# Altium footprint library Toi Library.PcbLib: 740 footprints (part 46 of 47)
Each footprint in its own frame and in the unit in brackets; x right, y up, seen from the top. Pads: shape width x height; smd on the part's side, far side on the other; paste and mask are expansions set on the pad; w line width, h text height; cw(c..) or ccw(c..) is an arc to the next point about the centre after c.
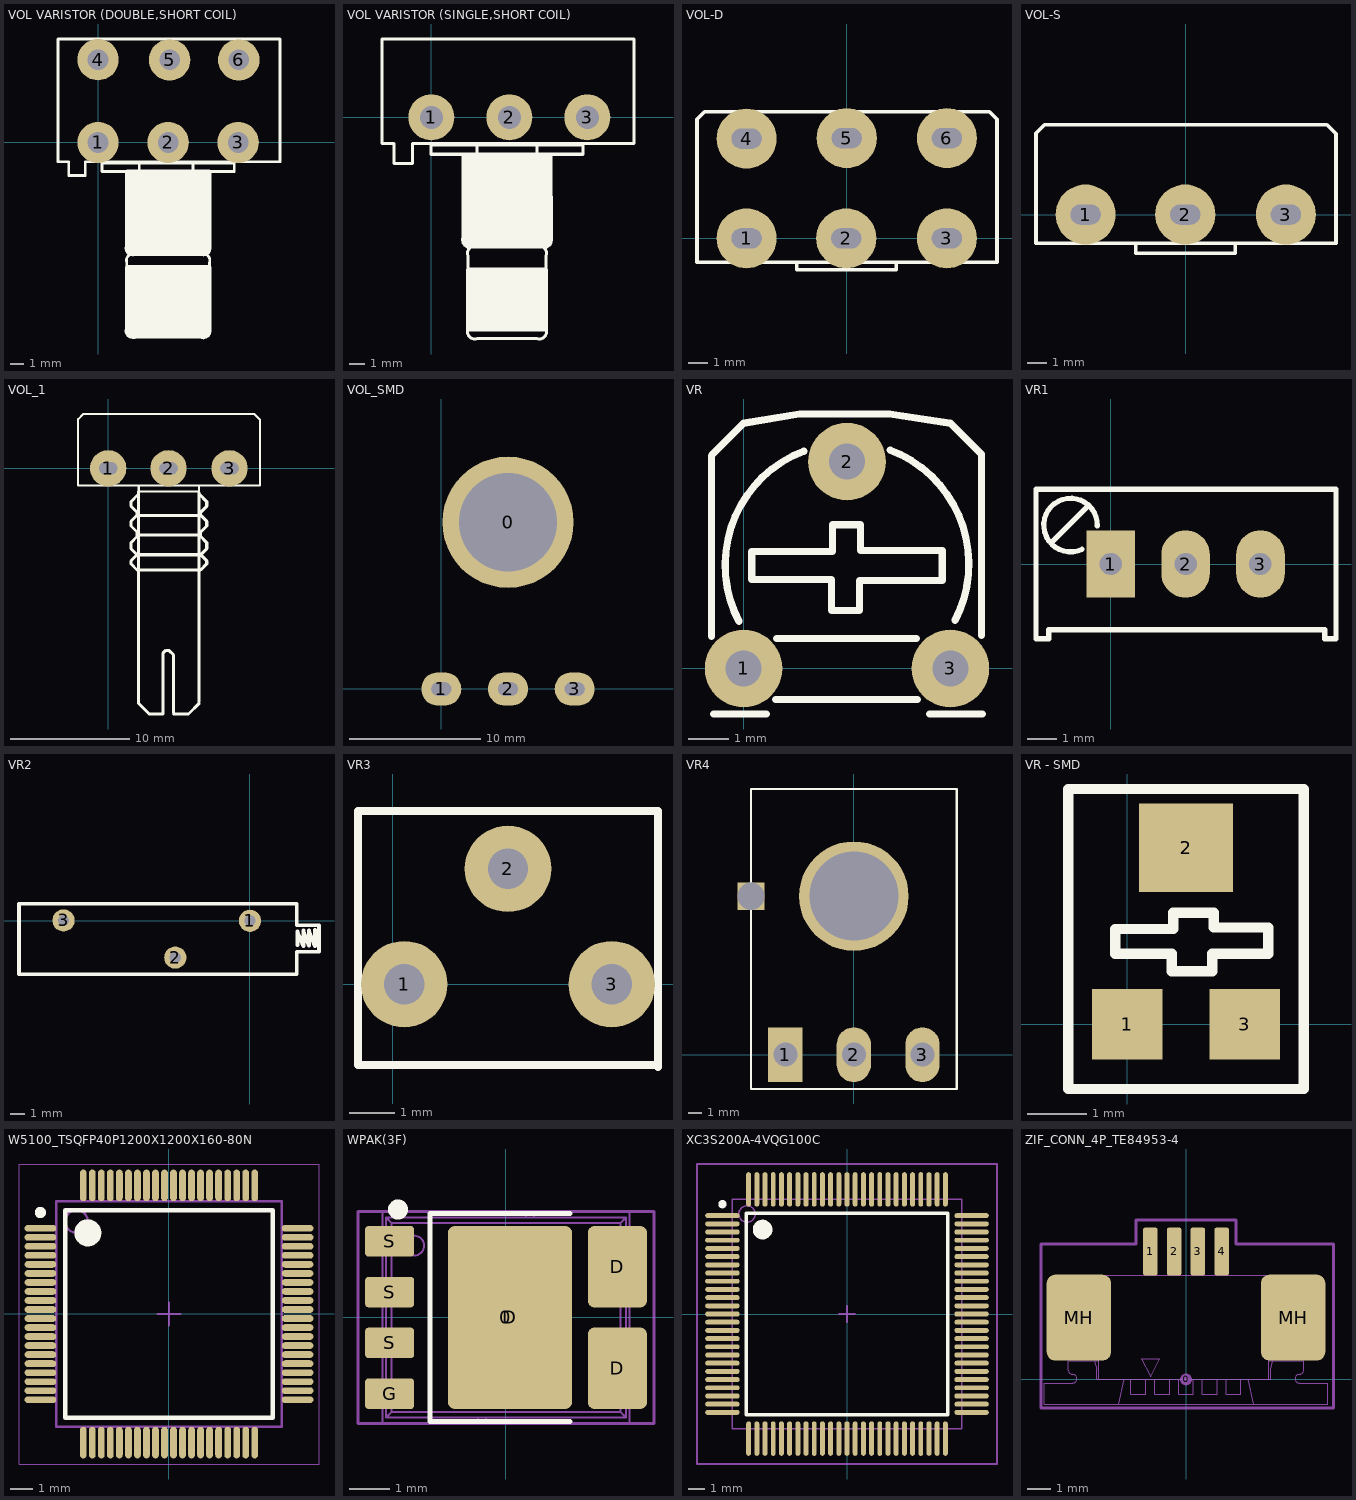
[diagram p45: the footprints below, top view; thin cyan lines are the x and y axes]

## VOL VARISTOR (DOUBLE,SHORT COIL) [mm]
pads (6):
  round 3 hole 1.5: 1(0,0) 2(5.08,0) 3(10.16,0) 4(0,6.003) 5(5.19,5.991) 6(10.201,5.991)
Top Overlay:
  region: 8.119,-2.009 8.158,-2.024 8.158,-2.025 8.174,-2.063 8.19,-2.101 8.193,-7.492 8.221,-7.632 8.217,-7.653 8.221,-7.675 8.184,-7.86 8.172,-7.878 8.168,-7.899 8.063,-8.056 8.045,-8.068 8.033,-8.086 7.876,-8.191 7.855,-8.195 7.837,-8.207 7.652,-8.244 7.631,-8.239 7.61,-8.244 7.459,-8.213 7.457,-8.212 2.691,-8.216 2.55,-8.244 2.529,-8.239 2.507,-8.244 2.322,-8.207 2.304,-8.195 2.283,-8.191 2.126,-8.086 2.114,-8.068 2.096,-8.056 1.991,-7.899 1.987,-7.878 1.975,-7.86 1.938,-7.675 1.943,-7.653 1.938,-7.632 1.968,-7.481 1.97,-7.478 1.97,-2.101 2.002,-2.025 2.079,-1.993 8.081,-1.993
  region: 8.158,-8.928 8.19,-9.004 8.19,-13.482 8.191,-13.484 8.221,-13.635 8.217,-13.656 8.221,-13.677 8.184,-13.863 8.172,-13.881 8.168,-13.902 8.063,-14.059 8.045,-14.071 8.033,-14.088 7.876,-14.193 7.855,-14.198 7.837,-14.21 7.652,-14.246 7.631,-14.242 7.61,-14.246 7.469,-14.218 2.703,-14.214 2.701,-14.216 2.55,-14.246 2.529,-14.242 2.507,-14.246 2.322,-14.209 2.305,-14.197 2.283,-14.193 2.127,-14.088 2.115,-14.07 2.097,-14.058 1.992,-13.901 1.988,-13.88 1.976,-13.862 1.939,-13.677 1.943,-13.656 1.939,-13.635 1.969,-13.484 1.97,-13.482 1.97,-9.004 2.002,-8.928 2.079,-8.896 8.081,-8.896
  lines w0.2: 2.679,-14.107 7.481,-14.107 ccw(c7.631,-13.656) 8.081,-13.506 8.081,-8.704 ccw(c7.631,-8.554) 7.481,-8.103 ; 2.679,-14.106 cw(c2.529,-13.656) 2.079,-13.506 2.079,-8.704 cw(c2.529,-8.554) 2.679,-8.104 ; 2.679,-8.103 cw(c2.529,-7.653) 2.079,-7.504 2.079,-2.101 8.081,-2.101 8.081,-7.504 cw(c7.631,-7.653) 7.481,-8.104 ; 2.679,-8.104 7.481,-8.104 ; 2.679,-8.104 7.481,-8.104 ; -2.897,-1.4 -2.123,-1.4 -2.123,-2.399 -0.923,-2.399 -0.923,-1.4 13.184,-1.4 13.184,7.504 -2.897,7.504 -2.897,-1.4 ; 0.278,-2.101 9.882,-2.101 9.882,-1.501 0.278,-1.501 0.278,-2.101 ; 2.979,-2.101 2.979,-1.501 6.881,-1.501 6.881,-2.101 2.979,-2.101

## VOL VARISTOR (SINGLE,SHORT COIL) [mm]
pads (3):
  round 3 hole 1.5: 1(0,0) 2(5.08,0) 3(10.16,0)
Top Overlay:
  region: 7.819,-2.309 7.858,-2.325 7.874,-2.363 7.889,-2.401 7.893,-7.792 7.921,-7.932 7.917,-7.954 7.921,-7.975 7.884,-8.16 7.872,-8.178 7.868,-8.199 7.763,-8.356 7.745,-8.368 7.733,-8.386 7.576,-8.491 7.555,-8.495 7.537,-8.507 7.352,-8.544 7.331,-8.539 7.31,-8.544 7.159,-8.514 7.157,-8.512 2.691,-8.516 2.55,-8.544 2.529,-8.54 2.507,-8.544 2.322,-8.507 2.304,-8.495 2.283,-8.491 2.126,-8.386 2.114,-8.368 2.096,-8.356 1.991,-8.199 1.987,-8.178 1.975,-8.16 1.938,-7.975 1.943,-7.954 1.938,-7.932 1.968,-7.781 1.97,-7.778 1.97,-2.401 2.002,-2.325 2.079,-2.293 7.781,-2.293
  region: 7.558,-9.828 7.589,-9.905 7.589,-13.807 7.558,-13.883 7.481,-13.915 2.379,-13.915 2.302,-13.883 2.271,-13.807 2.271,-9.905 2.302,-9.828 2.379,-9.797 7.481,-9.797
  lines w0.2: 2.078,-7.804 ccw(c2.529,-7.954) 2.679,-8.404 7.181,-8.404 ccw(c7.331,-7.954) 7.781,-7.804 7.781,-2.401 2.079,-2.401 2.079,-7.804 ; -3.197,-1.7 -3.197,5.102 13.184,5.102 13.184,-1.7 -1.223,-1.7 -1.223,-3.001 -2.424,-3.001 -2.424,-1.7 -3.197,-1.7 ; -0.022,-2.401 9.882,-2.401 9.882,-1.801 -0.022,-1.801 -0.022,-2.401 ; 2.379,-13.807 ccw(c2.829,-13.956) 2.979,-14.406 6.881,-14.407 ccw(c7.031,-13.956) 7.481,-13.807 7.481,-9.004 ccw(c7.031,-8.854) 6.881,-8.404 2.979,-8.404 ccw(c2.829,-8.854) 2.379,-9.004 2.379,-13.807 ; 2.979,-2.401 2.979,-1.801 6.881,-1.801 6.881,-2.401 2.979,-2.401

## VOL-D [mil] "Volume control Dual"
height 400
pads (6):
  round 120 hole 40 slot 60 at 0 deg: 1(-200,0) 2(-1,0) 3(200,0) 4(-200,199) 5(0,200) 6(200,200)
Top Overlay:
  lines w7: -100,-48 -100,-63 99,-63 99,-48 ; -299,-48 300,-48 300,238 285,253 -284,253 -299,238 -299,-48
3D body "SW3dPS-ALPHA-potentiometer stereo PCB mount.STEP": height 834.65, standoff -129.92, extent -338.65,-1309.27 330.65,299

## VOL-S [mil] "Volume control single"
height 400
pads (3):
  round 120 hole 40 slot 60 at 0 deg: 1(-200,0) 2(-1,0) 3(200,0)
Top Overlay:
  lines w7: -100,-57 -100,-77 99,-77 99,-57 ; -299,-57 300,-57 300,161 282,179 -282,179 -299,162 -299,-57

## VOL_1 [mil] "Resistorvar Volume"
pads (3):
  round 120 hole 40 slot 60 at 0 deg: 1(0,0) 2(199,0) 3(400,0)
Top Overlay:
  lines w7: 100,-57 100,-77 299,-77 299,-57 ; 101,-77 101,-57 ; -99,-57 -99,162 -82,179 482,179 500,161 500,-57 -99,-57
  lines w10: 95,-335 75,-315 75,-305 95,-285 75,-265 75,-245 95,-225 95,-210 75,-190 75,-175 95,-155 95,-145 75,-125 75,-110 100,-85 ; 95,-220 300,-220 ; 100,-770 100,-77 ; 100,-760 100,-775 135,-810 180,-810 180,-610 190,-600 200,-600 215,-615 215,-805 ; 100,-335 305,-335 325,-315 325,-305 305,-285 ; 100,-285 305,-285 ; 105,-155 300,-155 ; 215,-810 265,-810 300,-775 ; 300,-770 300,-80 ; 300,-85 325,-110 325,-125 305,-145 305,-155 325,-175 325,-190 305,-210 305,-225 325,-245 325,-265 305,-285
3D body "SW3dPS-Pot.STEP": height 839.35, standoff -130, extent -110,-818.11 510,188.11

## VOL_SMD [mil] "Resistorvar Volume"
pads (4):
  round 393.7 hole 295.28: 0(200,500)
  oval 120x100 hole 40 slot 60 at 0 deg: 1(0,0) 2(200,0) 3(400,0)
Bottom Overlay:
  circle w12: c400,150 r50
  circle w12: c200,150 r50
  circle w12: c0,150 r50
  circle w12: c200,500 r215.01
  lines w12: -57.25,301.71 cw(c200,500) 455.57,299.55 ; -55,299 127,299 ; -49,700 119,700 ; 281,298 455,298 ; 286,698 454,698 ; 455,295 500,250 500,-75 -100,-75 -100,255 ; -100,255 -55,300 -100,255
3D body "SW3dPS-omeg pot.STEP": height 866.14, standoff -407.48, extent -203.15,-247.08 600,947.08

## VR [mil] "Resistor Variable"
height 200
pads (3):
  round 75 hole 35: 1(0,0) 2(100,200) 3(200,0)
Top Overlay:
  lines w7: -31,31 -31,206 0,237 54,246 141.5,246 200,237 230,207 230,32 ; -29,-44 22,-44 ; -4.35,45.34 cw(c100,100) 58.1,210.1 ; 8,113 8,86 85,86 85,56 112,56 112,85 192,85 192,114 113,114 113,139 86,139 86,113 9,113 ; 31,-30 168,-30 ; 32,29 167,29 ; 141.9,211.1 cw(c100,101) 204.35,46.34 ; 180,-44 231,-44
3D body "SW3dPS-Trimpot Horizontal.STEP": height 165.35, standoff -220.47, extent -86.85,-30 306.85,371.57

## VR1 [mil] "Variable Resistor"
height 400
pads (3):
  rect 65x90 hole 30: 1(0,0)
  oval 65x90 hole 30: 2(100,0) 3(200,0)
Top Overlay:
  lines w7: -80,28 -30,78 ; -38.6,19.63 cw(c-53.79,52.05) -18.01,50.77 ; -100,-100 -83,-100 -83,-88 286,-88 286,-100 301,-100 301,100 -100,100 -100,-100
3D body "User Library-3296W.STEP": height 454.72, standoff -59.06, extent -86.6,-94.16 288.6,96

## VR2 [mil]
pads (3):
  round 60 hole 30: 1(0,0) 2(-201,-99) 3(-502,1)
Top Overlay:
  lines w10: 125,46 -622,46 -622,-144 125,-144 126,-144 126,-83 186,-83 186,-12 126,-12 126,46 ; 128,-66 128,-29 144,-68 144,-26 159,-67 159,-26 175,-68 175,-25
3D body "Trimmer_L_10K.STEP": height 250.6, standoff -209.24, extent -621.92,-144 187.92,46.16

## VR3 [mil] "Resistor Variable"
height 200
pads (3):
  round 75 hole 35: 1(10,0) 2(100,100) 3(190,0)
Top Overlay:
  lines w7: 227.95,-70 -30,-70 -30,150 230,150 230,-71.6
3D body "User Library-RM-063.STEP": height 413.39, standoff -31.87, extent -27.95,-71.6 227.95,150

## VR4 [mil] "Resistor Variable"
height 200
pads (5):
  rect 100x160 hole 70: 1(-200,0)
  oval 100x160 hole 70: 2(0,0) 3(200,0)
  rect 80x80 hole 80 square: ""(-300,462.5)
  round 320 hole 260: ""(0,462.5)
Top Overlay:
  lines w7: -300,-100 300,-100 300,775 -300,775 -300,-100
3D body "User Library-Perilla  P-4836 azul.STEP": height 751.18, standoff 200, extent -334.65,112.68 334.65,797.15
3D body "SW3dPS-Pot.STEP": height 716.22, standoff -290, extent -310,-200 310,770

## VR - SMD [mm] "Resistor Variable"
height 5.08
pads (3):
  rect 1.2x1.2 smd: 1(0,0) 3(2,0)
  rect 1.6x1.5 smd: 2(1,3)
Top Overlay:
  lines w0.178: -1,-1.1 -1,4 3,4 3,-1.1 -1,-1.1 ; -0.2,1.2 -0.2,1.62 0.784,1.62 0.784,1.9 1.47,1.9 1.47,1.646 2.4,1.646 2.4,1.2 1.445,1.2 1.445,0.9 0.759,0.9 0.759,1.2 -0.2,1.2
3D body "User Library-TC-33X-2.STEP": height 1.13, standoff -0.02, extent -0.8,-0.413 2.8,3.55

## W5100_TSQFP40P1200X1200X160-80N [mm] "TSQFP, 80-Leads, Body 10.00x10.00mm, Pitch 0.40mm, IPC Medium Density"
height 1.6
pads (80):
  oval 1.4x0.3 smd: 1(-5.7,3.8) 2(-5.7,3.4) 3(-5.7,3) 4(-5.7,2.6) 5(-5.7,2.2) 6(-5.7,1.8) 7(-5.7,1.4) 8(-5.7,1) 9(-5.7,0.6) 10(-5.7,0.2) 11(-5.7,-0.2) 12(-5.7,-0.6) 13(-5.7,-1) 14(-5.7,-1.4) 15(-5.7,-1.8) 16(-5.7,-2.2) 17(-5.7,-2.6) 18(-5.7,-3) 19(-5.7,-3.4) 20(-5.7,-3.8) 41(5.7,-3.8) 42(5.7,-3.4) 43(5.7,-3) 44(5.7,-2.6) 45(5.7,-2.2) 46(5.7,-1.8) 47(5.7,-1.4) 48(5.7,-1) 49(5.7,-0.6) 50(5.7,-0.2) 51(5.7,0.2) 52(5.7,0.6) 53(5.7,1) 54(5.7,1.4) 55(5.7,1.8) 56(5.7,2.2) 57(5.7,2.6) 58(5.7,3) 59(5.7,3.4) 60(5.7,3.8)
  oval 0.3x1.4 smd: 21(-3.8,-5.7) 22(-3.4,-5.7) 23(-3,-5.7) 24(-2.6,-5.7) 25(-2.2,-5.7) 26(-1.8,-5.7) 27(-1.4,-5.7) 28(-1,-5.7) 29(-0.6,-5.7) 30(-0.2,-5.7) 31(0.2,-5.7) 32(0.6,-5.7) 33(1,-5.7) 34(1.4,-5.7) 35(1.8,-5.7) 36(2.2,-5.7) 37(2.6,-5.7) 38(3,-5.7) 39(3.4,-5.7) 40(3.8,-5.7) 61(3.8,5.7) 62(3.4,5.7) 63(3,5.7) 64(2.6,5.7) 65(2.2,5.7) 66(1.8,5.7) 67(1.4,5.7) 68(1,5.7) 69(0.6,5.7) 70(0.2,5.7) 71(-0.2,5.7) 72(-0.6,5.7) 73(-1,5.7) 74(-1.4,5.7) 75(-1.8,5.7) 76(-2.2,5.7) 77(-2.6,5.7) 78(-3,5.7) 79(-3.4,5.7) 80(-3.8,5.7)
Top Overlay:
  circle w0.25: c-5.7,4.5 r0.125
  circle w0.6: c-3.6,3.6 r0.3
  lines w0.2: -4.6,-4.6 -4.6,4.6 4.6,4.6 4.6,-4.6 -4.6,-4.6
Mechanical 13:
  circle w0.1: c-4.1,4.1 r0.5
  lines w0.1: -5,-5 -5,5 5,5 5,-5 -5,-5
Mechanical 15:
  lines w0.05: -6.65,-6.65 -6.65,6.65 6.65,6.65 6.65,-6.65 -6.65,-6.65
  lines w0.1: -0.5,0 0.5,0 ; 0,-0.5 0,0.5
3D body: height 1.6, standoff 0, extent -6,-6 6,6

## WPAK(3F) [mm] "Footprint similar to SOIC-8, Body 5.1x6.1mm, Pitch 1.27mm, IPC Medium Density"
height 0.85
pads (8):
  round 1 on Mech15: 0(0,0)
  rrect10% 3.1x4.57 smd: D(0.1,0)
  rrect20% 1.47x2.03 smd: D(2.785,-1.27) D(2.785,1.27)
  rrect20% 1.22x0.76 smd: G(-2.91,-1.905) S(-2.91,-0.635) S(-2.91,0.635) S(-2.91,1.905)
Top Overlay:
  circle w0.25: c-2.7,2.7 r0.125
  lines w0.127: 1.6,-2.6 -1.9,-2.6 -1.9,2.6 1.6,2.6
Mechanical 13:
  circle w0.05: c-2.298,1.798 r0.25
  lines w0.05: -3.09,-2.115 -3.09,-2.64 -0.7,-2.64 ; -3.09,-1.695 -3.09,-0.845 ; -3.09,-0.425 -3.09,0.425 ; -3.09,0.845 -3.09,1.695 ; -3.09,2.115 -3.09,2.64 0.5,2.64 ; -3,-2.115 -3,-2.5 ; -3,-1.695 -3,-0.845 ; -3,-0.425 -3,0.425 ; -3,0.845 -3,1.695 ; -3,2.115 -3,2.5 ; -0.7,-2.5 -3,-2.5 ; -0.5,-2.64 3.09,-2.64 3.09,-2.115 ; -0.5,-2.5 3,-2.5 ; 0.5,2.5 -3,2.5 ; 0.7,2.5 3,2.5 ; 0.7,2.64 3.09,2.64 3.09,2.115 ; 3,-2.115 3,-2.5 ; 3,-1.695 3,-0.845 ; 3,-0.425 3,0.425 ; 3,0.845 3,1.695 ; 3,2.115 3,2.5 ; 3.09,-1.695 3.09,-0.845 ; 3.09,-0.425 3.09,0.425 ; 3.09,0.845 3.09,1.695 ; -3,-2.5 -2.864,-2.364 ; -3,2.5 -2.864,2.364 ; -2.864,-2.364 -2.864,2.364 ; -2.864,-2.364 2.864,-2.364 ; -2.864,2.364 2.864,2.364 ; 2.864,-2.364 3,-2.5 ; 2.864,-2.364 2.864,2.364 ; 2.864,2.364 3,2.5 ; -3.1,-2.115 -3.1,-1.695 -2.998,-1.695 -2.998,-2.115 -3.1,-2.115 ; -3.1,-0.845 -3.1,-0.425 -2.998,-0.425 -2.998,-0.845 -3.1,-0.845 ; -3.1,0.425 -3.1,0.845 -2.998,0.845 -2.998,0.425 -3.1,0.425 ; -3.1,1.695 -3.1,2.115 -2.998,2.115 -2.998,1.695 -3.1,1.695 ; -0.7,-2.65 -0.5,-2.65 -0.5,-2.498 -0.7,-2.498 -0.7,-2.65 ; 0.5,2.498 0.7,2.498 0.7,2.65 0.5,2.65 0.5,2.498 ; 2.998,-2.115 2.998,-1.695 3.1,-1.695 3.1,-2.115 2.998,-2.115 ; 2.998,-0.845 2.998,-0.425 3.1,-0.425 3.1,-0.845 2.998,-0.845 ; 2.998,0.425 2.998,0.845 3.1,0.845 3.1,0.425 2.998,0.425 ; 2.998,1.695 2.998,2.115 3.1,2.115 3.1,1.695 2.998,1.695
Mechanical 15:
  lines w0.076: -3.7,-2.65 -3.7,2.65 3.7,2.65 3.7,-2.65 -3.7,-2.65
3D body "WPAK(3F).STEP": height 0.85, standoff 0, extent -3.1,-2.65 3.1,2.65

## XC3S200A-4VQG100C [mm] "Thin QFP, 100-Leads, Body 14x14mm, Pitch 0.5mm, IPC Low Density"
height 1.2
pads (100):
  oval 2.1x0.3 smd: 1(-7.6,6) 2(-7.6,5.5) 3(-7.6,5) 4(-7.6,4.5) 5(-7.6,4) 6(-7.6,3.5) 7(-7.6,3) 8(-7.6,2.5) 9(-7.6,2) 10(-7.6,1.5) 11(-7.6,1) 12(-7.6,0.5) 13(-7.6,0) 14(-7.6,-0.5) 15(-7.6,-1) 16(-7.6,-1.5) 17(-7.6,-2) 18(-7.6,-2.5) 19(-7.6,-3) 20(-7.6,-3.5) 21(-7.6,-4) 22(-7.6,-4.5) 23(-7.6,-5) 24(-7.6,-5.5) 25(-7.6,-6) 51(7.6,-6) 52(7.6,-5.5) 53(7.6,-5) 54(7.6,-4.5) 55(7.6,-4) 56(7.6,-3.5) 57(7.6,-3) 58(7.6,-2.5) 59(7.6,-2) 60(7.6,-1.5) 61(7.6,-1) 62(7.6,-0.5) 63(7.6,0) 64(7.6,0.5) 65(7.6,1) 66(7.6,1.5) 67(7.6,2) 68(7.6,2.5) 69(7.6,3) 70(7.6,3.5) 71(7.6,4) 72(7.6,4.5) 73(7.6,5) 74(7.6,5.5) 75(7.6,6)
  oval 0.3x2.1 smd: 26(-6,-7.6) 27(-5.5,-7.6) 28(-5,-7.6) 29(-4.5,-7.6) 30(-4,-7.6) 31(-3.5,-7.6) 32(-3,-7.6) 33(-2.5,-7.6) 34(-2,-7.6) 35(-1.5,-7.6) 36(-1,-7.6) 37(-0.5,-7.6) 38(0,-7.6) 39(0.5,-7.6) 40(1,-7.6) 41(1.5,-7.6) 42(2,-7.6) 43(2.5,-7.6) 44(3,-7.6) 45(3.5,-7.6) 46(4,-7.6) 47(4.5,-7.6) 48(5,-7.6) 49(5.5,-7.6) 50(6,-7.6) 76(6,7.6) 77(5.5,7.6) 78(5,7.6) 79(4.5,7.6) 80(4,7.6) 81(3.5,7.6) 82(3,7.6) 83(2.5,7.6) 84(2,7.6) 85(1.5,7.6) 86(1,7.6) 87(0.5,7.6) 88(0,7.6) 89(-0.5,7.6) 90(-1,7.6) 91(-1.5,7.6) 92(-2,7.6) 93(-2.5,7.6) 94(-3,7.6) 95(-3.5,7.6) 96(-4,7.6) 97(-4.5,7.6) 98(-5,7.6) 99(-5.5,7.6) 100(-6,7.6)
Top Overlay:
  circle w0.6: c-5.15,5.15 r0.3
  circle w0.25: c-7.6,6.7 r0.125
  lines w0.2: -6.15,-6.15 6.15,-6.15 6.15,6.15 -6.15,6.15 -6.15,-6.15
Mechanical 13:
  circle w0.1: c-6.1,6.1 r0.5
  lines w0.1: -7,-7 7,-7 7,7 -7,7 -7,-7
Mechanical 15:
  lines w0.1: -0.5,0 0.5,0 ; 0,-0.5 0,0.5 ; -9.15,-9.15 9.15,-9.15 9.15,9.15 -9.15,9.15 -9.15,-9.15
3D body: height 1.3, standoff 0, extent -8.047,-8.052 8,7.995

## ZIF_CONN_4P_TE84953-4 [mm] "TE Connectivity 4-pin ZIF connector"
height 2.74
pads (7):
  round 0.5 on Mech15: 0(0,0)
  rrect25% 0.61x2 smd: 1(-1.5,5.375) 2(-0.5,5.375) 3(0.5,5.375) 4(1.5,5.375)
  rrect25% 2.7x3.6 smd: MH(-4.5,2.6) MH(4.5,2.6)
Mechanical 13:
  lines w0.05: -4.56,3.1 -3.93,3.1 ; -4.56,4.37 -4.56,0.87 -3.67,0.87 -3.67,0 ; -4.28,4.37 -4.18,3.997 -4.18,3.1 ; -4.18,0.86 -4.18,0.87 ; -3.982,0.87 -3.982,0.86 -5.072,0.86 cw(c-5.072,0.96) -5.172,0.96 -5.172,1.261 cw(c-5.072,1.261) -5.072,1.361 -4.762,1.361 ccw(c-4.762,1.461) -4.662,1.461 -4.662,1.763 ccw(c-4.762,1.763) -4.762,1.863 -5.072,1.863 cw(c-5.072,1.963) -5.172,1.963 -5.172,2.264 cw(c-5.072,2.264) -5.072,2.364 -4.762,2.364 ccw(c-4.762,2.464) -4.662,2.464 -4.662,2.766 ccw(c-4.762,2.766) -4.762,2.866 -5.072,2.866 cw(c-5.072,2.966) -5.172,2.966 -5.172,3.267 cw(c-5.072,3.267) -5.072,3.367 -4.762,3.367 ccw(c-4.762,3.467) -4.662,3.467 -4.662,3.769 ccw(c-4.762,3.769) -4.762,3.869 -5.072,3.869 cw(c-5.072,3.969) -5.172,3.969 -5.172,4.27 cw(c-5.072,4.27) -5.072,4.37 5.072,4.37 cw(c5.072,4.27) 5.172,4.27 5.172,3.969 cw(c5.072,3.969) 5.072,3.869 4.762,3.869 ccw(c4.762,3.769) 4.662,3.769 4.662,3.467 ccw(c4.762,3.467) 4.762,3.367 5.072,3.367 cw(c5.072,3.267) 5.172,3.267 5.172,2.966 cw(c5.072,2.966) 5.072,2.866 4.762,2.866 ccw(c4.762,2.766) 4.662,2.766 4.662,2.464 ccw(c4.762,2.464) 4.762,2.364 5.072,2.364 cw(c5.072,2.264) 5.172,2.264 5.172,1.963 cw(c5.072,1.963) 5.072,1.863 4.762,1.863 ccw(c4.762,1.763) 4.662,1.763 4.662,1.461 ccw(c4.762,1.461) 4.762,1.361 5.072,1.361 cw(c5.072,1.261) 5.172,1.261 5.172,0.96 cw(c5.072,0.96) 5.072,0.86 4.232,0.86 4.229,0.87 ; -3.93,0.87 -3.93,3.997 -3.83,4.37 ; -3.846,0.79 -3.75,0.43 -3.75,0 3.55,0 3.55,0.43 3.646,0.79 ; -3.67,0.79 -4.94,0.79 -4.94,0.39 ccw(c-4.76,0.39) -4.76,0.21 cw(c-4.76,0.03) -4.76,-0.15 -5.96,-0.15 -5.96,-1.04 5.96,-1.04 5.96,-0.15 4.76,-0.15 cw(c4.76,0.03) 4.76,0.21 ccw(c4.76,0.39) 4.94,0.39 4.94,0.79 3.47,0.79 ; -2.82,-1.04 -2.59,0 ; -2.311,0 -2.311,-0.63 -1.691,-0.63 -1.691,0 ; -1.596,4.37 -1.596,5.51 -1.396,5.51 -1.396,4.37 ; -1.596,4.88 -1.396,4.88 ; -1.596,5.01 -1.396,5.01 ; -1.596,5.38 -1.396,5.38 ; -1.311,0 -1.311,-0.63 -0.691,-0.63 -0.691,0 ; -0.596,4.37 -0.596,5.51 -0.396,5.51 -0.396,4.37 ; -0.596,4.88 -0.396,4.88 ; -0.596,5.01 -0.396,5.01 ; -0.596,5.38 -0.396,5.38 ; -0.31,0 -0.31,-0.63 0.309,-0.63 0.309,0 ; 0.405,4.37 0.405,5.51 0.604,5.51 0.604,4.37 ; 0.405,4.88 0.604,4.88 ; 0.405,5.01 0.604,5.01 ; 0.405,5.38 0.604,5.38 ; 0.69,0 0.69,-0.63 1.309,-0.63 1.309,0 ; 1.405,4.37 1.405,5.51 1.605,5.51 1.605,4.37 ; 1.405,4.88 1.605,4.88 ; 1.405,5.01 1.605,5.01 ; 1.405,5.38 1.605,5.38 ; 1.69,0 1.69,-0.63 2.31,-0.63 2.31,0 ; 2.59,0 2.82,-1.04 ; 3.47,0 3.47,0.87 4.56,0.87 4.56,4.37 ; 3.83,0.87 3.93,1.243 3.93,4.37 ; 3.93,2.14 4.18,2.14 4.18,1.243 4.28,0.87 ; 4.18,1.92 4.56,1.92 ; -1.871,0.87 -1.49,0.11 -1.111,0.87 -1.871,0.87
Mechanical 15:
  lines w0.127: -6.1,-1.2 6.2,-1.2 6.2,5.7 2.1,5.7 2.1,6.7 -2.1,6.7 -2.1,5.7 -6.1,5.7 -6.1,-1.2
3D body: height 2.58, standoff 0, extent -5.96,-1.04 5.96,5.51